# Altium footprint library RDM_ALT_PCB.PcbLib: 171 footprints (part 4 of 11)
Each footprint in its own frame and in the unit in brackets; x right, y up, seen from the top. Pads: shape width x height; smd on the part's side, far side on the other; paste and mask are expansions set on the pad; w line width, h text height; cw(c..) or ccw(c..) is an arc to the next point about the centre after c.
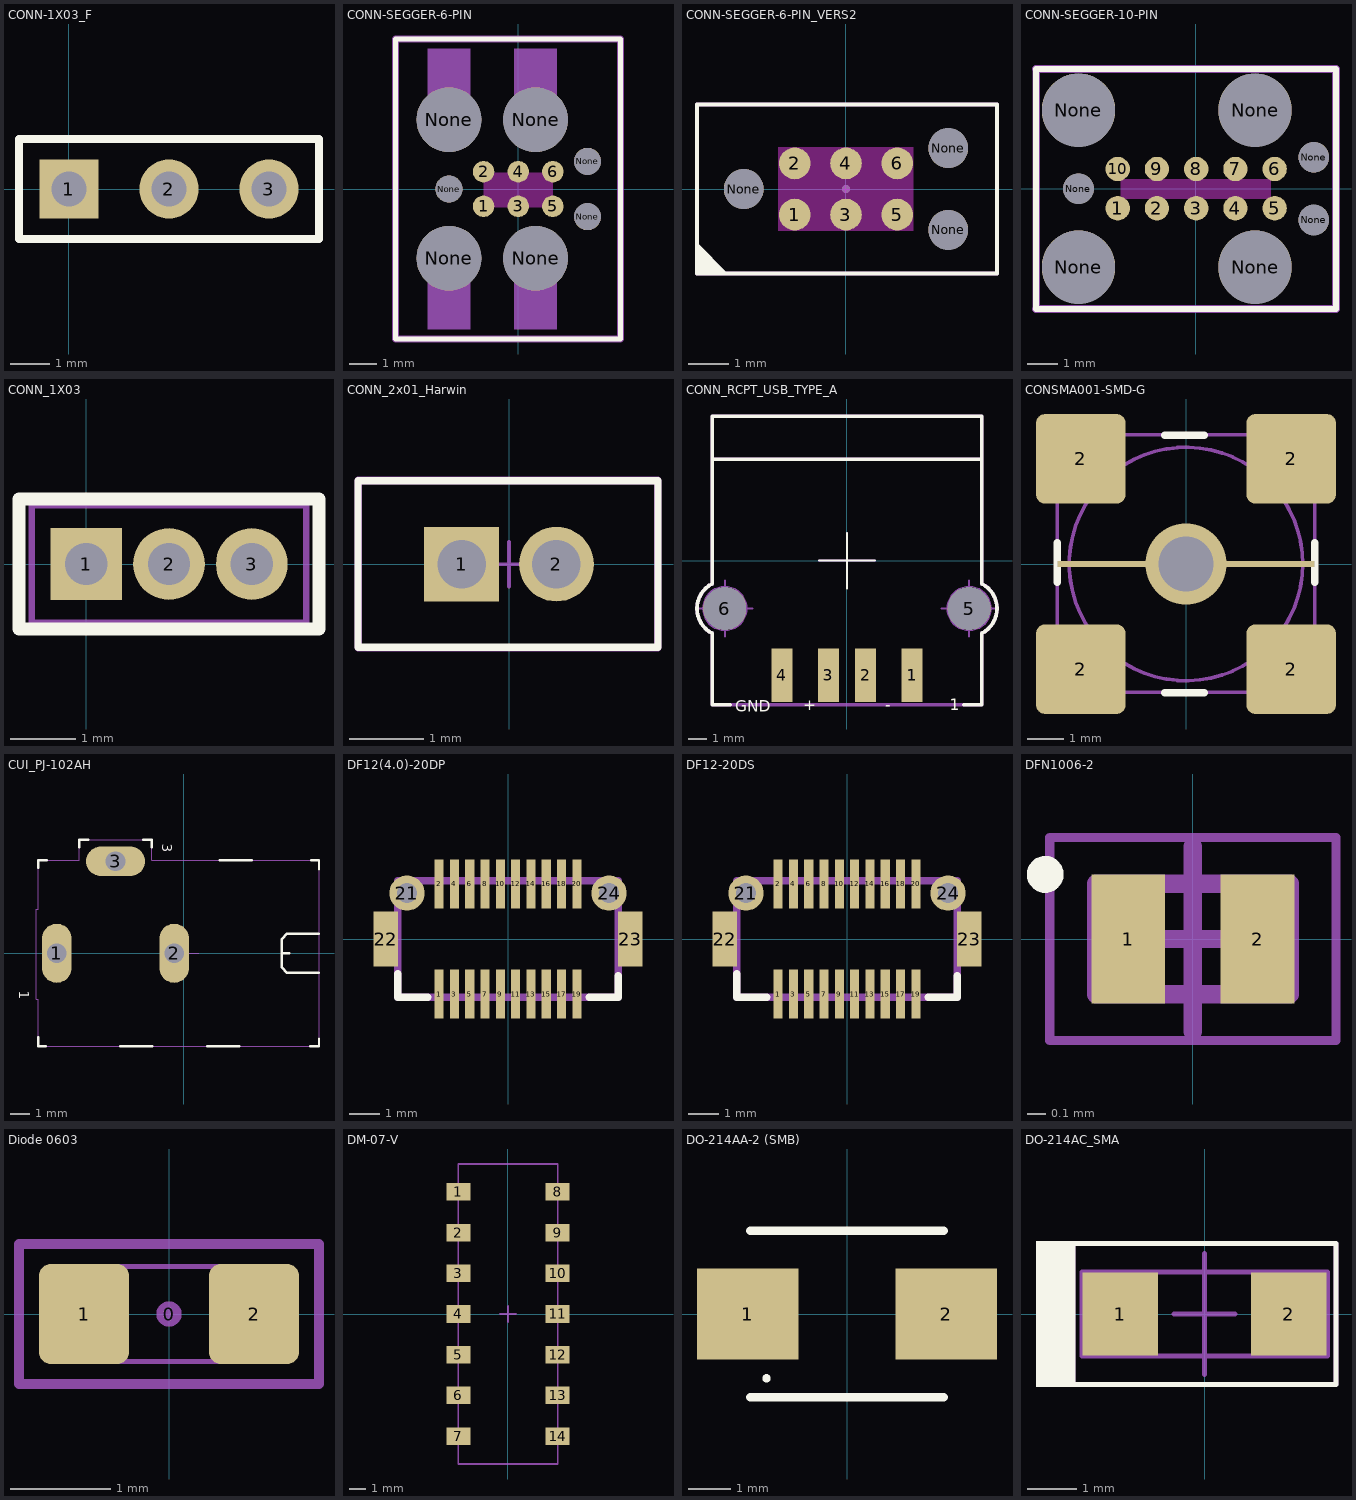
[diagram p3: the footprints below, top view; thin cyan lines are the x and y axes]

## CONN-1X03_F [mm] "Connector; Header; 3 Position, Female"
pads (3):
  rect 1.5x1.5 hole 0.9: 1(0,0)
  round 1.5 hole 0.9: 2(2.54,0) 3(5.08,0)
Top Overlay:
  lines w0.2: -1.27,-1.27 -1.27,1.27 6.35,1.27 6.35,-1.27 -1.27,-1.27
Mechanical 13:
  lines w0.1: -1.27,-1.27 -1.27,1.27 6.35,1.27 6.35,-1.27 -1.27,-1.27
3D body "SL-103-G-12.stp": height 2.28, standoff -2.54, extent -1.27,-1.27 6.35,1.27

## CONN-SEGGER-6-PIN [mil] "J-Link 6-pin Needle Adapter"
pads (13):
  round 31 smd: 1(-50,-25) 2(-50,25) 3(0,-25) 4(0,25) 5(50,-25) 6(50,25)
  round 93.5 hole 93.5 unplated: None(-100,-100) None(-100,100) None(25,-100) None(25,100)
  round 39 hole 39 unplated: None(-100,0) None(100,-40) None(100,40)
Top Overlay:
  lines w7.87: -177.17,-216.54 147.64,-216.54 147.64,216.54 -177.17,216.54 -177.17,-216.54
Keep-Out Layer:
  region: -50,23.62 50,23.62 50,-26.38 -50,-26.38
Mechanical 4:
  region: -5.5,202.75 55.5,202.75 55.5,100 -5.5,100
  region: -130.5,202.75 -69.5,202.75 -69.5,100 -130.5,100
  region: -5.5,-100 55.5,-100 55.5,-202.75 -5.5,-202.75
  region: -130.5,-100 -69.5,-100 -69.5,-202.75 -130.5,-202.75
  region: -5.5,202.75 55.5,202.75 55.5,100 -5.5,100
  region: -130.5,202.75 -69.5,202.75 -69.5,100 -130.5,100
  region: -5.5,-100 55.5,-100 55.5,-202.75 -5.5,-202.75
  region: -130.5,-100 -69.5,-100 -69.5,-202.75 -130.5,-202.75
  region: -5.5,202.75 55.5,202.75 55.5,100 -5.5,100
  region: -130.5,202.75 -69.5,202.75 -69.5,100 -130.5,100
  region: -5.5,-100 55.5,-100 55.5,-202.75 -5.5,-202.75
  region: -130.5,-100 -69.5,-100 -69.5,-202.75 -130.5,-202.75
  region: -5.5,202.75 55.5,202.75 55.5,100 -5.5,100
  region: -130.5,202.75 -69.5,202.75 -69.5,100 -130.5,100
  region: -5.5,-100 55.5,-100 55.5,-202.75 -5.5,-202.75
  region: -130.5,-100 -69.5,-100 -69.5,-202.75 -130.5,-202.75
  region: -5.5,202.75 55.5,202.75 55.5,100 -5.5,100
  region: -130.5,202.75 -69.5,202.75 -69.5,100 -130.5,100
  region: -5.5,-100 55.5,-100 55.5,-202.75 -5.5,-202.75
  region: -130.5,-100 -69.5,-100 -69.5,-202.75 -130.5,-202.75
  region: -5.5,202.75 55.5,202.75 55.5,100 -5.5,100
  region: -130.5,202.75 -69.5,202.75 -69.5,100 -130.5,100
  region: -5.5,-100 55.5,-100 55.5,-202.75 -5.5,-202.75
  region: -130.5,-100 -69.5,-100 -69.5,-202.75 -130.5,-202.75
Mechanical 29 (Mech29):
  lines w10: -177.17,-216.54 -177.17,216.54 147.64,216.54 147.64,-216.54 -177.17,-216.54

## CONN-SEGGER-6-PIN_VERS2 [mil] "J-Link 6-pin Needle Adapter without holes for alignment"
pads (9):
  round 31 smd paste-30.98: 1(-50,-25) 2(-50,25) 3(0,-25) 4(0,25) 5(50,-25) 6(50,25)
  round 39 hole 39 unplated: None(-100,0) None(100,-40) None(100,40)
Top Layer keep-out:
  region: -66,41 66,41 66,-41 -66,-41
Top Overlay:
  region: -115.67,-82.68 -145.67,-82.68 -145.67,-52.68
  lines w3.94: -145.67,-82.68 -145.67,82.68 147.64,82.68 147.64,-82.68 -145.67,-82.68
Mechanical 15:
  circle w3.94: c0,0 r2
  lines w3.94: -145.67,-82.68 -145.67,82.68 147.64,82.68 147.64,-82.68 -145.67,-82.68

## CONN-SEGGER-10-PIN [mil] "J-Link 10-pin Needle Adapter"
pads (17):
  round 31 smd: 1(-99.61,-25) 2(-49.61,-25) 3(0.39,-25) 4(50.39,-25) 5(100.39,-25) 6(100.39,25) 7(50.39,25) 8(0.39,25) 9(-49.61,25) 10(-99.61,25)
  round 93.5 hole 93.5 unplated: None(-149.61,-100) None(-149.61,100) None(75.39,-100) None(75.39,100)
  round 39 hole 39 unplated: None(-149.61,0) None(150.39,-39.96) None(150.39,39.96)
Top Layer keep-out:
  region: -95.47,11.81 95.47,11.81 95.47,-12.8 -95.47,-12.8
Top Overlay:
  lines w7.87: -203.74,-153.54 -203.74,152.56 178.54,152.56 178.54,-153.54 -203.34,-153.54
Mechanical 15:
  lines w10: -203.74,-153.54 178.54,-153.54 178.54,152.56 -203.74,152.56 ; -203.34,-153.54 -203.34,152.56

## CONN_1X03 [mm] "Connector; Header; 3 Position"
pads (3):
  rect 1.1x1.1 hole 0.65: 1(0,0)
  round 1.1 hole 0.65: 2(1.27,0) 3(2.54,0)
Top Overlay:
  lines w0.2: -1.03,-1 -1.03,1 3.57,1 3.57,-1 -1.03,-1
Mechanical 13:
  lines w0.1: -0.835,-0.9 3.375,-0.9 3.375,0.9 -0.835,0.9 -0.835,-0.9 ; -0.25,-0.075 -0.25,0.075 0.25,0.075 0.25,-0.075 -0.25,-0.075 ; 1.02,-0.075 1.02,0.075 1.52,0.075 1.52,-0.075 1.02,-0.075 ; 2.29,-0.075 2.29,0.075 2.79,0.075 2.79,-0.075 2.29,-0.075
Mechanical 15:
  lines w0.01: -0.25,0.075 0.25,-0.075 ; 1.02,0.075 1.52,-0.075 ; 2.29,0.075 2.79,-0.075
3D body: height 4.4, standoff 0.15, extent -0.835,-0.9 3.375,0.9
3D body: height 0, standoff -2.25, extent -0.25,-0.075 0.25,0.075
3D body: height 0, standoff -2.25, extent 1.02,-0.075 1.52,0.075
3D body: height 0, standoff -2.25, extent 2.29,-0.075 2.79,0.075

## CONN_2x01_Harwin [mm] "Connector Header, vertical, 2 Pos, Pitch 1.27mm"
pads (2):
  rect 1x1 hole 0.65: 1(-0.635,0)
  round 1 hole 0.65: 2(0.635,0)
Top Overlay:
  lines w0.1: -2.022,-1.113 -2.022,1.118 1.995,1.118 1.995,-1.113 -2.022,-1.113
Mechanical 13:
  lines w0.05: -0.3,0 0.3,0 ; 0,-0.3 0,0.3 ; -0.835,-0.2 -0.435,-0.2 -0.435,0.2 -0.835,0.2 -0.835,-0.2 ; 0.435,-0.2 0.435,0.2 0.835,0.2 0.835,-0.2 0.435,-0.2
  lines w0.1: -2.021,-1.117 1.995,-1.117 1.995,1.118 -2.021,1.118 -2.021,-1.117
Mechanical 15:
  lines w0.01: -0.885,0.075 -0.385,-0.075 ; 0.385,0.075 0.885,-0.075
  lines w0.05: -0.3,0 0.3,0 ; 0,-0.3 0,0.3
  lines w0.1: -2.018,-1.117 -2.018,1.123 1.991,1.123 1.991,-1.117 -2.018,-1.117
3D body: height 5.3, standoff -3.3, extent -0.835,-0.2 -0.435,0.2
3D body: height 5.3, standoff -3.3, extent 0.435,-0.2 0.835,0.2
3D body "14357.stp": height 5.65, standoff 0.6, extent -1.965,-0.95 1.935,0.95
3D body: height 0.6, standoff 0.05, extent -1.791,-1.05 1.761,1.05

## CONN_RCPT_USB_TYPE_A [mm] "87583-3010RPLF Amphenol  4Pin SMD"
height 1
pads (6):
  rect 1.12x2.88 smd: 1(3.5,-6.16) 2(1,-6.16) 3(-1,-6.16) 4(-3.5,-6.16)
  round 2.3 hole 2.3: 5(6.57,-2.58) 6(-6.57,-2.58)
Top Overlay:
  lines w0.1: -1.5,0 1.5,0 ; 0,-1.5 0,1.5
  lines w0.2: -7.25,-3.917 cw(c-6.57,-2.58) -7.245,-1.241 -7.245,7.73 ; -7.249,-7.76 -7.249,-3.915 ; -7.247,-7.76 -6.296,-7.76 ; -7.245,5.459 7.254,5.459 ; -7.245,7.759 7.254,7.759 ; 6.299,-7.76 7.25,-7.76 7.25,-3.915 ; 7.248,-1.242 cw(c6.57,-2.58) 7.25,-3.917 ; 7.254,-1.23 7.254,7.73
  text "-" at 2.057,-8.052 h0.6
  text "+" at -2.362,-8.052 h0.6
  text "GND" at -6.02,-8.128 h0.6
  text "1" at 5.537,-8.052 h0.6
Mechanical 13:
  circle w0.08: c6.57,-2.58 r1.18
  circle w0.08: c-6.57,-2.58 r1.18
  lines w0.1: -8.07,-2.58 -5.07,-2.58 ; -6.57,-4.08 -6.57,-1.08 ; 5.07,-2.58 8.07,-2.58 ; 6.57,-4.08 6.57,-1.08
  lines w0.2: -7.248,-3.917 cw(c-6.567,-2.58) -7.243,-1.241 -7.243,7.73 ; -7.247,-3.915 -7.247,-7.76 7.252,-7.76 7.252,-3.915 ; -7.243,5.459 7.256,5.459 ; -7.243,7.759 7.256,7.759 ; 7.25,-1.242 cw(c6.573,-2.58) 7.253,-3.917 ; 7.256,-1.23 7.256,7.73
  text "1" at 5.537,-8.723 h0.6
Mechanical 15:
  circle w0.08: c-6.57,-2.58 r1.18
  circle w0.08: c6.57,-2.58 r1.18
  lines w0.1: -8.07,-2.58 -5.07,-2.58 ; -6.57,-4.08 -6.57,-1.08 ; -1.5,0 1.5,0 ; 0,-1.5 0,1.5 ; 5.07,-2.58 8.07,-2.58 ; 6.57,-4.08 6.57,-1.08
  lines w0.2: -7.25,-3.917 cw(c-6.57,-2.58) -7.245,-1.241 -7.245,7.73 ; -7.249,-3.915 -7.249,-7.76 7.25,-7.76 7.25,-3.915 ; -7.245,5.459 7.254,5.459 ; -7.245,7.759 7.254,7.759 ; 7.248,-1.242 cw(c6.57,-2.58) 7.25,-3.917 ; 7.254,-1.23 7.254,7.73
  text "1" at 5.537,-8.723 h0.6
Multi-Layer:
  region: -0.674,-3.318
3D body "87583-3010RPALF.STP--3DModel-STEP-90149.STEP": height 7.33, standoff -3.04, extent -7.25,-7.243 7.25,7.64

## CONSMA001-SMD-G [mm]
pads (5):
  rect 7x0.15 smd: 1(0,0)
  rrect20% 2.44x2.44 smd: 2(-2.86,-2.86) 2(-2.86,2.86) 2(2.86,-2.86) 2(2.86,2.86)
via 0,0 diameter 2.2 hole 1.5
Top Overlay:
  lines w0.2: -3.5,-0.5 -3.5,0.58 ; -0.58,-3.5 0.5,-3.5 ; -0.58,3.5 0.5,3.5 ; 3.5,-0.5 3.5,0.58
Mechanical 13:
  circle w0.1: c0,0 r3.175
  lines w0.1: -3.5,2.013 -2,2.013 -2,3.513 ; 2,3.513 2,2.013 3.5,2.013 ; 3.5,-1.987 2,-1.987 2,-3.487 -2,-3.487 -2,-1.987 -3.5,-1.987 -3.5,-3.487 ; -3.5,-3.487 3.5,-3.487 3.5,3.513 -3.5,3.513 -3.5,-3.487
3D body "SMA-J-P-H-ST-MT1.stp": height 10.55, standoff 0, extent -3.175,-3.175 3.175,3.175

## CUI_PJ-102AH [mm]
pads (3):
  oval 1.508x3.016 hole 1: 1(-6.5,0) 2(-0.5,0)
  oval 3.016x1.508 hole 1: 3(-3.5,4.7)
Top Overlay:
  lines w0.127: -7.45,-4.302 -7.45,-4.75 -7.06,-4.75 ; -7.45,4.36 -7.45,4.75 -7.002,4.75 ; -5.35,5.41 -5.35,5.8 -4.902,5.8 ; -3.251,-4.749 -1.626,-4.749 ; -2.078,5.8 -1.65,5.8 ; -1.642,5.41 -1.642,5.8 ; 1.194,-4.751 2.82,-4.751 ; 1.829,4.751 3.454,4.751 ; 5,0 5.39,0 ; 6.452,-4.75 6.9,-4.75 6.9,-4.36 ; 6.51,4.75 6.9,4.75 6.9,4.302 ; 6.9,-1 5.274,-1 5,-0.726 5,-0.5 5,0.5 5,0.726 5.274,1 6.9,1
  text "3" at -1.118,5.588 h0.5
  text "1" at -8.433,-1.905 h0.5
Mechanical 13:
  lines w0: -7,-0.8 -7,0.8 -6,0.8 -6,-0.8 -7,-0.8 ; -4.3,4.2 -4.3,5.2 -2.7,5.2 -2.7,4.2 -4.3,4.2 ; -1,-0.8 -1,0.8 0,0.8 0,-0.8 -1,-0.8
Mechanical 15:
  lines w0.05: -0.75,0 0.75,0 ; 0,-0.75 0,0.75 ; 6.9,-4.75 6.9,4.75 -1.65,4.75 -1.65,5.8 -5.35,5.8 -5.35,4.75 -7.45,4.75 -7.45,2.25 -7.55,2.25 -7.55,-2.35 -7.45,-2.35 -7.45,-4.75 6.9,-4.75 ; 6.9,-4.75 6.9,-4.75
  text "1" at -8.433,-1.905 h0.5
  text "3" at -1.118,5.588 h0.5
3D body "PJ-102AH--3DModel-STEP-56544.STEP": height 11.01, standoff -3.49, extent -7.5,-4.65 6.9,4.75

## DF12(4.0)-20DP [mm]
pads (24):
  rect 0.3x1.6 smd: 1(-2.25,-1.8) 2(-2.25,1.8) 3(-1.75,-1.8) 4(-1.75,1.8) 5(-1.25,-1.8) 6(-1.25,1.8) 7(-0.75,-1.8) 8(-0.75,1.8) 9(-0.25,-1.8) 10(-0.25,1.8) 11(0.25,-1.8) 12(0.25,1.8) 13(0.75,-1.8) 14(0.75,1.8) 15(1.25,-1.8) 16(1.25,1.8) 17(1.75,-1.8) 18(1.75,1.8) 19(2.25,-1.8) 20(2.25,1.8)
  round 1.15 hole 0.65: 21(-3.3,1.5) 24(3.3,1.5)
  rect 0.8x1.8 smd: 22(-4,0) 23(4,0)
Top Overlay:
  lines w0.254: -3.6,-1.135 -3.6,-1.9 -2.62,-1.9 ; 2.666,-1.9 3.6,-1.9 3.6,-1.2
Mechanical 15:
  lines w0.254: -3.6,-1.9 -3.6,1.9 3.6,1.9 3.6,-1.9 -3.6,-1.9
3D body: height 8.83, standoff 0.73, extent -2,13.5 -2,13.5
3D body "DF12(3.5)-20DP-0.5V.stp": height 2.81, standoff -0.59, extent -4.05,-2.3 4.05,2.3

## DF12-20DS [mm]
pads (24):
  rect 0.3x1.6 smd: 1(-2.25,-1.8) 2(-2.25,1.8) 3(-1.75,-1.8) 4(-1.75,1.8) 5(-1.25,-1.8) 6(-1.25,1.8) 7(-0.75,-1.8) 8(-0.75,1.8) 9(-0.25,-1.8) 10(-0.25,1.8) 11(0.25,-1.8) 12(0.25,1.8) 13(0.75,-1.8) 14(0.75,1.8) 15(1.25,-1.8) 16(1.25,1.8) 17(1.75,-1.8) 18(1.75,1.8) 19(2.25,-1.8) 20(2.25,1.8)
  round 1.15 hole 0.65: 21(-3.3,1.5) 24(3.3,1.5)
  rect 0.8x1.8 smd: 22(-4,0) 23(4,0)
Top Overlay:
  lines w0.254: -3.6,-1.135 -3.6,-1.9 -2.62,-1.9 ; 2.666,-1.9 3.6,-1.9 3.6,-1.2
Mechanical 15:
  lines w0.254: -3.6,-1.9 -3.6,1.9 3.6,1.9 3.6,-1.9 -3.6,-1.9
3D body "DF12-20DS-0.5V.stp": height 2.7, standoff -0.6, extent -4.05,-2.3 4.05,2.3

## DFN1006-2 [mm] "DFN, 2-Leads, Body 0.57x1.00mm, Pitch 0.65mm, IPC Medium Density"
height 0.53
pads (2):
  rect 0.4x0.7 smd: 1(-0.35,0) 2(0.35,0)
Top Overlay:
  circle w0.1: c-0.8,0.35 r0.05
Mechanical 13:
  lines w0.1: -0.525,-0.3 0.525,-0.3 0.525,0.3 -0.525,0.3 -0.525,-0.3
Mechanical 15:
  lines w0.05: -0.775,-0.55 0.775,-0.55 0.775,0.55 -0.775,0.55 -0.775,-0.55
  lines w0.1: -0.5,0 0.5,0 ; 0,-0.5 0,0.5
3D body: height 0.53, standoff 0, extent -0.525,-0.3 0.525,0.3

## Diode 0603 [mm]
pads (3):
  round 0.254 on Mech15: 0(0,0)
  rrect25% 0.9x1 smd: 1(-0.85,0) 2(0.85,0)
Mechanical 13:
  lines w0.05: -0.475,-0.474 0.475,-0.474 ; -0.475,0.474 0.475,0.474 ; -0.875,-0.475 -0.875,0.475 -0.475,0.475 -0.475,-0.475 -0.875,-0.475 ; 0.475,-0.475 0.875,-0.475 0.875,0.475 0.475,0.475 0.475,-0.475
Mechanical 15:
  lines w0.1: -1.5,-0.7 1.5,-0.7 1.5,0.7 -1.5,0.7 -1.5,-0.7

## DM-07-V [mm] "DIP Switch 7 Position"
height 3.7
pads (14):
  rect 1.5x1.1 smd: 1(-3.1,7.62) 2(-3.1,5.08) 3(-3.1,2.54) 4(-3.1,0) 5(-3.1,-2.54) 6(-3.1,-5.08) 7(-3.1,-7.62) 8(3.1,7.62) 9(3.1,5.08) 10(3.1,2.54) 11(3.1,0) 12(3.1,-2.54) 13(3.1,-5.08) 14(3.1,-7.62)
Mechanical 13:
  lines w0.1: -3.1,-9.36 3.1,-9.36 3.1,9.36 -3.1,9.36 -3.1,-9.36
Mechanical 15:
  lines w0.1: -0.5,0 0.5,0 ; 0,-0.5 0,0.5
3D body: height 3.7, standoff 0.7, extent -3.1,-9.36 3.1,9.36

## DO-214AA-2 (SMB) [mm]
pads (2):
  rect 2.4x2.16 smd: 1(-2.35,0) 2(2.35,0)
Top Overlay:
  circle w0.2: c-1.905,-1.524 r0
  lines w0.2: -2.285,-1.97 2.285,-1.97 ; -2.285,1.97 2.285,1.97
3D body "tisp4240m3bj.stp": height 2.13, standoff 0, extent -2.7,-1.81 2.7,1.81

## DO-214AC_SMA [mm] "Diode_SMA_15MQ060NTR"
pads (2):
  rect 1.52x1.68 smd: 1(-1.7,0) 2(1.7,0)
Top Overlay:
  rectangle: -3.4,-1.475 -2.65,1.475
  lines w0.1: -2.65,-1.425 -2.65,1.425 2.65,1.425 2.65,-1.425 -2.65,-1.425
Mechanical 15:
  lines w0.1: -0.612,0 0.613,0 ; 0,-1.225 0,1.225 ; -2.65,-1.425 2.65,-1.425 2.65,1.425 -2.65,1.425 -2.65,-1.425
Mechanical 29 (Mech29):
  lines w0.1: 2.45,-0.85 -2.475,-0.85 -2.475,0.85 2.475,0.85 2.475,-0.85
3D body "ES1D--3DModel-STEP-56544.STEP": height 2.51, standoff 0.01, extent -2.6,-1.363 2.6,1.362